# Altium footprint library ref-packages-longpad.PCBLIB: 1527 footprints (part 78 of 103)
Each footprint in its own frame and in the unit in brackets; x right, y up, seen from the top. Pads: shape width x height; smd on the part's side, far side on the other; paste and mask are expansions set on the pad; w line width, h text height; cw(c..) or ccw(c..) is an arc to the next point about the centre after c.
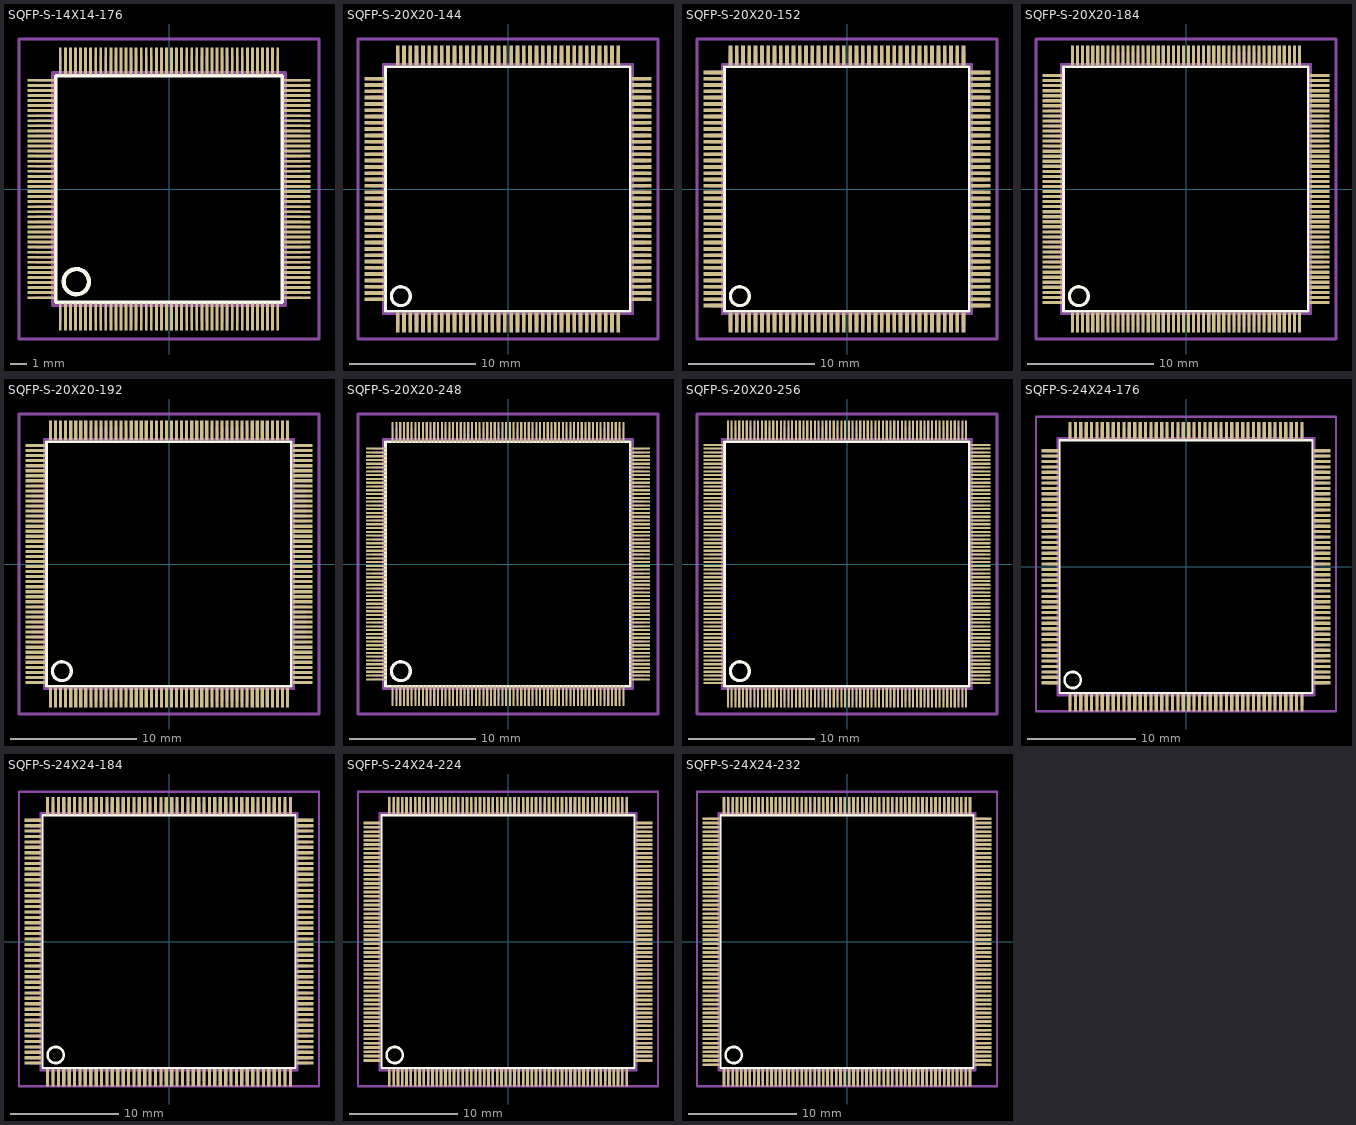
[diagram p77: the footprints below, top view; thin cyan lines are the x and y axes]

## SQFP-S-14X14-176 [mm]
pads (176):
  rect 0.17x1.6 smd: 1(-6.45,-7.6) 2(-6.15,-7.6) 3(-5.85,-7.6) 4(-5.55,-7.6) 5(-5.25,-7.6) 6(-4.95,-7.6) 7(-4.65,-7.6) 8(-4.35,-7.6) 9(-4.05,-7.6) 10(-3.75,-7.6) 11(-3.45,-7.6) 12(-3.15,-7.6) 13(-2.85,-7.6) 14(-2.55,-7.6) 15(-2.25,-7.6) 16(-1.95,-7.6) 17(-1.65,-7.6) 18(-1.35,-7.6) 19(-1.05,-7.6) 20(-0.75,-7.6) 21(-0.45,-7.6) 22(-0.15,-7.6) 23(0.15,-7.6) 24(0.45,-7.6) 25(0.75,-7.6) 26(1.05,-7.6) 27(1.35,-7.6) 28(1.65,-7.6) 29(1.95,-7.6) 30(2.25,-7.6) 31(2.55,-7.6) 32(2.85,-7.6) 33(3.15,-7.6) 34(3.45,-7.6) 35(3.75,-7.6) 36(4.05,-7.6) 37(4.35,-7.6) 38(4.65,-7.6) 39(4.95,-7.6) 40(5.25,-7.6) 41(5.55,-7.6) 42(5.85,-7.6) 43(6.15,-7.6) 44(6.45,-7.6) 89(6.45,7.6) 90(6.15,7.6) 91(5.85,7.6) 92(5.55,7.6) 93(5.25,7.6) 94(4.95,7.6) 95(4.65,7.6) 96(4.35,7.6) 97(4.05,7.6) 98(3.75,7.6) 99(3.45,7.6) 100(3.15,7.6) 101(2.85,7.6) 102(2.55,7.6) 103(2.25,7.6) 104(1.95,7.6) 105(1.65,7.6) 106(1.35,7.6) 107(1.05,7.6) 108(0.75,7.6) 109(0.45,7.6) 110(0.15,7.6) 111(-0.15,7.6) 112(-0.45,7.6) 113(-0.75,7.6) 114(-1.05,7.6) 115(-1.35,7.6) 116(-1.65,7.6) 117(-1.95,7.6) 118(-2.25,7.6) 119(-2.55,7.6) 120(-2.85,7.6) 121(-3.15,7.6) 122(-3.45,7.6) 123(-3.75,7.6) 124(-4.05,7.6) 125(-4.35,7.6) 126(-4.65,7.6) 127(-4.95,7.6) 128(-5.25,7.6) 129(-5.55,7.6) 130(-5.85,7.6) 131(-6.15,7.6) 132(-6.45,7.6)
  rect 1.6x0.17 smd: 45(7.6,-6.45) 46(7.6,-6.15) 47(7.6,-5.85) 48(7.6,-5.55) 49(7.6,-5.25) 50(7.6,-4.95) 51(7.6,-4.65) 52(7.6,-4.35) 53(7.6,-4.05) 54(7.6,-3.75) 55(7.6,-3.45) 56(7.6,-3.15) 57(7.6,-2.85) 58(7.6,-2.55) 59(7.6,-2.25) 60(7.6,-1.95) 61(7.6,-1.65) 62(7.6,-1.35) 63(7.6,-1.05) 64(7.6,-0.75) 65(7.6,-0.45) 66(7.6,-0.15) 67(7.6,0.15) 68(7.6,0.45) 69(7.6,0.75) 70(7.6,1.05) 71(7.6,1.35) 72(7.6,1.65) 73(7.6,1.95) 74(7.6,2.25) 75(7.6,2.55) 76(7.6,2.85) 77(7.6,3.15) 78(7.6,3.45) 79(7.6,3.75) 80(7.6,4.05) 81(7.6,4.35) 82(7.6,4.65) 83(7.6,4.95) 84(7.6,5.25) 85(7.6,5.55) 86(7.6,5.85) 87(7.6,6.15) 88(7.6,6.45) 133(-7.6,6.45) 134(-7.6,6.15) 135(-7.6,5.85) 136(-7.6,5.55) 137(-7.6,5.25) 138(-7.6,4.95) 139(-7.6,4.65) 140(-7.6,4.35) 141(-7.6,4.05) 142(-7.6,3.75) 143(-7.6,3.45) 144(-7.6,3.15) 145(-7.6,2.85) 146(-7.6,2.55) 147(-7.6,2.25) 148(-7.6,1.95) 149(-7.6,1.65) 150(-7.6,1.35) 151(-7.6,1.05) 152(-7.6,0.75) 153(-7.6,0.45) 154(-7.6,0.15) 155(-7.6,-0.15) 156(-7.6,-0.45) 157(-7.6,-0.75) 158(-7.6,-1.05) 159(-7.6,-1.35) 160(-7.6,-1.65) 161(-7.6,-1.95) 162(-7.6,-2.25) 163(-7.6,-2.55) 164(-7.6,-2.85) 165(-7.6,-3.15) 166(-7.6,-3.45) 167(-7.6,-3.75) 168(-7.6,-4.05) 169(-7.6,-4.35) 170(-7.6,-4.65) 171(-7.6,-4.95) 172(-7.6,-5.25) 173(-7.6,-5.55) 174(-7.6,-5.85) 175(-7.6,-6.15) 176(-7.6,-6.45)
Top Overlay:
  circle w0.254: c-5.5,-5.5 r0.75
  lines w0.203: -6.72,-6.71 6.71,-6.71 6.71,6.71 -6.72,6.71 -6.72,-6.71
Mechanical 16:
  drawing of 180 lines, arcs and shapes, not listed
Mechanical 27:
  lines w0.2: -8.9,-8.9 -8.9,8.9 8.9,8.9 8.9,-8.9 -8.9,-8.9

## SQFP-S-20X20-144 [mil]
pads (144):
  rect 11.81x62.99 smd: 1(-344.49,-417.32) 2(-324.8,-417.32) 3(-305.12,-417.32) 4(-285.43,-417.32) 5(-265.75,-417.32) 6(-246.06,-417.32) 7(-226.38,-417.32) 8(-206.69,-417.32) 9(-187.01,-417.32) 10(-167.32,-417.32) 11(-147.64,-417.32) 12(-127.95,-417.32) 13(-108.27,-417.32) 14(-88.58,-417.32) 15(-68.9,-417.32) 16(-49.21,-417.32) 17(-29.53,-417.32) 18(-9.84,-417.32) 19(9.84,-417.32) 20(29.53,-417.32) 21(49.21,-417.32) 22(68.9,-417.32) 23(88.58,-417.32) 24(108.27,-417.32) 25(127.95,-417.32) 26(147.64,-417.32) 27(167.32,-417.32) 28(187.01,-417.32) 29(206.69,-417.32) 30(226.38,-417.32) 31(246.06,-417.32) 32(265.75,-417.32) 33(285.43,-417.32) 34(305.12,-417.32) 35(324.8,-417.32) 36(344.49,-417.32) 73(344.49,417.32) 74(324.8,417.32) 75(305.12,417.32) 76(285.43,417.32) 77(265.75,417.32) 78(246.06,417.32) 79(226.38,417.32) 80(206.69,417.32) 81(187.01,417.32) 82(167.32,417.32) 83(147.64,417.32) 84(127.95,417.32) 85(108.27,417.32) 86(88.58,417.32) 87(68.9,417.32) 88(49.21,417.32) 89(29.53,417.32) 90(9.84,417.32) 91(-9.84,417.32) 92(-29.53,417.32) 93(-49.21,417.32) 94(-68.9,417.32) 95(-88.58,417.32) 96(-108.27,417.32) 97(-127.95,417.32) 98(-147.64,417.32) 99(-167.32,417.32) 100(-187.01,417.32) 101(-206.69,417.32) 102(-226.38,417.32) 103(-246.06,417.32) 104(-265.75,417.32) 105(-285.43,417.32) 106(-305.12,417.32) 107(-324.8,417.32) 108(-344.49,417.32)
  rect 62.99x11.81 smd: 37(417.32,-344.49) 38(417.32,-324.8) 39(417.32,-305.12) 40(417.32,-285.43) 41(417.32,-265.75) 42(417.32,-246.06) 43(417.32,-226.38) 44(417.32,-206.69) 45(417.32,-187.01) 46(417.32,-167.32) 47(417.32,-147.64) 48(417.32,-127.95) 49(417.32,-108.27) 50(417.32,-88.58) 51(417.32,-68.9) 52(417.32,-49.21) 53(417.32,-29.53) 54(417.32,-9.84) 55(417.32,9.84) 56(417.32,29.53) 57(417.32,49.21) 58(417.32,68.9) 59(417.32,88.58) 60(417.32,108.27) 61(417.32,127.95) 62(417.32,147.64) 63(417.32,167.32) 64(417.32,187.01) 65(417.32,206.69) 66(417.32,226.38) 67(417.32,246.06) 68(417.32,265.75) 69(417.32,285.43) 70(417.32,305.12) 71(417.32,324.8) 72(417.32,344.49) 109(-417.32,344.49) 110(-417.32,324.8) 111(-417.32,305.12) 112(-417.32,285.43) 113(-417.32,265.75) 114(-417.32,246.06) 115(-417.32,226.38) 116(-417.32,206.69) 117(-417.32,187.01) 118(-417.32,167.32) 119(-417.32,147.64) 120(-417.32,127.95) 121(-417.32,108.27) 122(-417.32,88.58) 123(-417.32,68.9) 124(-417.32,49.21) 125(-417.32,29.53) 126(-417.32,9.84) 127(-417.32,-9.84) 128(-417.32,-29.53) 129(-417.32,-49.21) 130(-417.32,-68.9) 131(-417.32,-88.58) 132(-417.32,-108.27) 133(-417.32,-127.95) 134(-417.32,-147.64) 135(-417.32,-167.32) 136(-417.32,-187.01) 137(-417.32,-206.69) 138(-417.32,-226.38) 139(-417.32,-246.06) 140(-417.32,-265.75) 141(-417.32,-285.43) 142(-417.32,-305.12) 143(-417.32,-324.8) 144(-417.32,-344.49)
Top Overlay:
  circle w10: c-334.65,-334.65 r29.53
  lines w8: -382.68,-382.28 382.28,-382.28 382.28,382.28 -382.68,382.28 -382.68,-382.28
Mechanical 16:
  rectangle: -350.39,-429.13 -338.58,-391.73
  rectangle: -330.71,-429.13 -318.9,-391.73
  rectangle: -311.02,-429.13 -299.21,-391.73
  rectangle: -291.34,-429.13 -279.53,-391.73
  rectangle: -271.65,-429.13 -259.84,-391.73
  rectangle: -251.97,-429.13 -240.16,-391.73
  rectangle: -232.28,-429.13 -220.47,-391.73
  rectangle: -212.6,-429.13 -200.79,-391.73
  rectangle: -192.91,-429.13 -181.1,-391.73
  rectangle: -173.23,-429.13 -161.42,-391.73
  rectangle: -153.54,-429.13 -141.73,-391.73
  rectangle: -133.86,-429.13 -122.05,-391.73
  rectangle: -114.17,-429.13 -102.36,-391.73
  rectangle: -94.49,-429.13 -82.68,-391.73
  rectangle: -74.8,-429.13 -62.99,-391.73
  rectangle: -55.12,-429.13 -43.31,-391.73
  rectangle: -35.43,-429.13 -23.62,-391.73
  rectangle: -15.75,-429.13 -3.94,-391.73
  rectangle: 3.94,-429.13 15.75,-391.73
  rectangle: 23.62,-429.13 35.43,-391.73
  rectangle: 43.31,-429.13 55.12,-391.73
  rectangle: 62.99,-429.13 74.8,-391.73
  rectangle: 82.68,-429.13 94.49,-391.73
  rectangle: 102.36,-429.13 114.17,-391.73
  rectangle: 122.05,-429.13 133.86,-391.73
  rectangle: 141.73,-429.13 153.54,-391.73
  rectangle: 161.42,-429.13 173.23,-391.73
  rectangle: 181.1,-429.13 192.91,-391.73
  rectangle: 200.79,-429.13 212.6,-391.73
  rectangle: 220.47,-429.13 232.28,-391.73
  rectangle: 240.16,-429.13 251.97,-391.73
  rectangle: 259.84,-429.13 271.65,-391.73
  rectangle: 279.53,-429.13 291.34,-391.73
  rectangle: 299.21,-429.13 311.02,-391.73
  rectangle: 318.9,-429.13 330.71,-391.73
  rectangle: 338.58,-429.13 350.39,-391.73
  rectangle: 391.73,-350.39 429.13,-338.58
  rectangle: 391.73,-330.71 429.13,-318.9
  rectangle: 391.73,-311.02 429.13,-299.21
  rectangle: 391.73,-291.34 429.13,-279.53
  rectangle: 391.73,-271.65 429.13,-259.84
  rectangle: 391.73,-251.97 429.13,-240.16
  rectangle: 391.73,-232.28 429.13,-220.47
  rectangle: 391.73,-212.6 429.13,-200.79
  rectangle: 391.73,-192.91 429.13,-181.1
  rectangle: 391.73,-173.23 429.13,-161.42
  rectangle: 391.73,-153.54 429.13,-141.73
  rectangle: 391.73,-133.86 429.13,-122.05
  rectangle: 391.73,-114.17 429.13,-102.36
  rectangle: 391.73,-94.49 429.13,-82.68
  rectangle: 391.73,-74.8 429.13,-62.99
  rectangle: 391.73,-55.12 429.13,-43.31
  rectangle: 391.73,-35.43 429.13,-23.62
  rectangle: 391.73,-15.75 429.13,-3.94
  rectangle: 391.73,3.94 429.13,15.75
  rectangle: 391.73,23.62 429.13,35.43
  rectangle: 391.73,43.31 429.13,55.12
  rectangle: 391.73,62.99 429.13,74.8
  rectangle: 391.73,82.68 429.13,94.49
  rectangle: 391.73,102.36 429.13,114.17
  rectangle: 391.73,122.05 429.13,133.86
  rectangle: 391.73,141.73 429.13,153.54
  rectangle: 391.73,161.42 429.13,173.23
  rectangle: 391.73,181.1 429.13,192.91
  rectangle: 391.73,200.79 429.13,212.6
  rectangle: 391.73,220.47 429.13,232.28
  rectangle: 391.73,240.16 429.13,251.97
  rectangle: 391.73,259.84 429.13,271.65
  rectangle: 391.73,279.53 429.13,291.34
  rectangle: 391.73,299.21 429.13,311.02
  rectangle: 391.73,318.9 429.13,330.71
  rectangle: 391.73,338.58 429.13,350.39
  rectangle: 338.58,391.73 350.39,429.13
  rectangle: 318.9,391.73 330.71,429.13
  rectangle: 299.21,391.73 311.02,429.13
  rectangle: 279.53,391.73 291.34,429.13
  rectangle: 259.84,391.73 271.65,429.13
  rectangle: 240.16,391.73 251.97,429.13
  rectangle: 220.47,391.73 232.28,429.13
  rectangle: 200.79,391.73 212.6,429.13
  rectangle: 181.1,391.73 192.91,429.13
  rectangle: 161.42,391.73 173.23,429.13
  rectangle: 141.73,391.73 153.54,429.13
  rectangle: 122.05,391.73 133.86,429.13
  rectangle: 102.36,391.73 114.17,429.13
  rectangle: 82.68,391.73 94.49,429.13
  rectangle: 62.99,391.73 74.8,429.13
  rectangle: 43.31,391.73 55.12,429.13
  rectangle: 23.62,391.73 35.43,429.13
  rectangle: 3.94,391.73 15.75,429.13
  rectangle: -15.75,391.73 -3.94,429.13
  rectangle: -35.43,391.73 -23.62,429.13
  rectangle: -55.12,391.73 -43.31,429.13
  rectangle: -74.8,391.73 -62.99,429.13
  rectangle: -94.49,391.73 -82.68,429.13
  rectangle: -114.17,391.73 -102.36,429.13
  rectangle: -133.86,391.73 -122.05,429.13
  rectangle: -153.54,391.73 -141.73,429.13
  rectangle: -173.23,391.73 -161.42,429.13
  rectangle: -192.91,391.73 -181.1,429.13
  rectangle: -212.6,391.73 -200.79,429.13
  rectangle: -232.28,391.73 -220.47,429.13
  rectangle: -251.97,391.73 -240.16,429.13
  rectangle: -271.65,391.73 -259.84,429.13
  rectangle: -291.34,391.73 -279.53,429.13
  rectangle: -311.02,391.73 -299.21,429.13
  rectangle: -330.71,391.73 -318.9,429.13
  rectangle: -350.39,391.73 -338.58,429.13
  rectangle: -429.13,338.58 -391.73,350.39
  rectangle: -429.13,318.9 -391.73,330.71
  rectangle: -429.13,299.21 -391.73,311.02
  rectangle: -429.13,279.53 -391.73,291.34
  rectangle: -429.13,259.84 -391.73,271.65
  rectangle: -429.13,240.16 -391.73,251.97
  rectangle: -429.13,220.47 -391.73,232.28
  rectangle: -429.13,200.79 -391.73,212.6
  rectangle: -429.13,181.1 -391.73,192.91
  rectangle: -429.13,161.42 -391.73,173.23
  rectangle: -429.13,141.73 -391.73,153.54
  rectangle: -429.13,122.05 -391.73,133.86
  rectangle: -429.13,102.36 -391.73,114.17
  rectangle: -429.13,82.68 -391.73,94.49
  rectangle: -429.13,62.99 -391.73,74.8
  rectangle: -429.13,43.31 -391.73,55.12
  rectangle: -429.13,23.62 -391.73,35.43
  rectangle: -429.13,3.94 -391.73,15.75
  rectangle: -429.13,-15.75 -391.73,-3.94
  rectangle: -429.13,-35.43 -391.73,-23.62
  rectangle: -429.13,-55.12 -391.73,-43.31
  rectangle: -429.13,-74.8 -391.73,-62.99
  rectangle: -429.13,-94.49 -391.73,-82.68
  rectangle: -429.13,-114.17 -391.73,-102.36
  rectangle: -429.13,-133.86 -391.73,-122.05
  rectangle: -429.13,-153.54 -391.73,-141.73
  rectangle: -429.13,-173.23 -391.73,-161.42
  rectangle: -429.13,-192.91 -391.73,-181.1
  rectangle: -429.13,-212.6 -391.73,-200.79
  rectangle: -429.13,-232.28 -391.73,-220.47
  rectangle: -429.13,-251.97 -391.73,-240.16
  rectangle: -429.13,-271.65 -391.73,-259.84
  rectangle: -429.13,-291.34 -391.73,-279.53
  rectangle: -429.13,-311.02 -391.73,-299.21
  rectangle: -429.13,-330.71 -391.73,-318.9
  rectangle: -429.13,-350.39 -391.73,-338.58
  lines w8: -390.16,-390.16 390.16,-390.16 390.16,390.16 -390.16,390.16 -390.16,-390.16
Mechanical 27:
  lines w7.87: -468.5,-468.5 -468.5,468.5 468.5,468.5 468.5,-468.5 -468.5,-468.5

## SQFP-S-20X20-152 [mil]
pads (152):
  rect 11.81x62.99 smd: 1(-364.17,-417.32) 2(-344.49,-417.32) 3(-324.8,-417.32) 4(-305.12,-417.32) 5(-285.43,-417.32) 6(-265.75,-417.32) 7(-246.06,-417.32) 8(-226.38,-417.32) 9(-206.69,-417.32) 10(-187.01,-417.32) 11(-167.32,-417.32) 12(-147.64,-417.32) 13(-127.95,-417.32) 14(-108.27,-417.32) 15(-88.58,-417.32) 16(-68.9,-417.32) 17(-49.21,-417.32) 18(-29.53,-417.32) 19(-9.84,-417.32) 20(9.84,-417.32) 21(29.53,-417.32) 22(49.21,-417.32) 23(68.9,-417.32) 24(88.58,-417.32) 25(108.27,-417.32) 26(127.95,-417.32) 27(147.64,-417.32) 28(167.32,-417.32) 29(187.01,-417.32) 30(206.69,-417.32) 31(226.38,-417.32) 32(246.06,-417.32) 33(265.75,-417.32) 34(285.43,-417.32) 35(305.12,-417.32) 36(324.8,-417.32) 37(344.49,-417.32) 38(364.17,-417.32) 77(364.17,417.32) 78(344.49,417.32) 79(324.8,417.32) 80(305.12,417.32) 81(285.43,417.32) 82(265.75,417.32) 83(246.06,417.32) 84(226.38,417.32) 85(206.69,417.32) 86(187.01,417.32) 87(167.32,417.32) 88(147.64,417.32) 89(127.95,417.32) 90(108.27,417.32) 91(88.58,417.32) 92(68.9,417.32) 93(49.21,417.32) 94(29.53,417.32) 95(9.84,417.32) 96(-9.84,417.32) 97(-29.53,417.32) 98(-49.21,417.32) 99(-68.9,417.32) 100(-88.58,417.32) 101(-108.27,417.32) 102(-127.95,417.32) 103(-147.64,417.32) 104(-167.32,417.32) 105(-187.01,417.32) 106(-206.69,417.32) 107(-226.38,417.32) 108(-246.06,417.32) 109(-265.75,417.32) 110(-285.43,417.32) 111(-305.12,417.32) 112(-324.8,417.32) 113(-344.49,417.32) 114(-364.17,417.32)
  rect 62.99x11.81 smd: 39(417.32,-364.17) 40(417.32,-344.49) 41(417.32,-324.8) 42(417.32,-305.12) 43(417.32,-285.43) 44(417.32,-265.75) 45(417.32,-246.06) 46(417.32,-226.38) 47(417.32,-206.69) 48(417.32,-187.01) 49(417.32,-167.32) 50(417.32,-147.64) 51(417.32,-127.95) 52(417.32,-108.27) 53(417.32,-88.58) 54(417.32,-68.9) 55(417.32,-49.21) 56(417.32,-29.53) 57(417.32,-9.84) 58(417.32,9.84) 59(417.32,29.53) 60(417.32,49.21) 61(417.32,68.9) 62(417.32,88.58) 63(417.32,108.27) 64(417.32,127.95) 65(417.32,147.64) 66(417.32,167.32) 67(417.32,187.01) 68(417.32,206.69) 69(417.32,226.38) 70(417.32,246.06) 71(417.32,265.75) 72(417.32,285.43) 73(417.32,305.12) 74(417.32,324.8) 75(417.32,344.49) 76(417.32,364.17) 115(-417.32,364.17) 116(-417.32,344.49) 117(-417.32,324.8) 118(-417.32,305.12) 119(-417.32,285.43) 120(-417.32,265.75) 121(-417.32,246.06) 122(-417.32,226.38) 123(-417.32,206.69) 124(-417.32,187.01) 125(-417.32,167.32) 126(-417.32,147.64) 127(-417.32,127.95) 128(-417.32,108.27) 129(-417.32,88.58) 130(-417.32,68.9) 131(-417.32,49.21) 132(-417.32,29.53) 133(-417.32,9.84) 134(-417.32,-9.84) 135(-417.32,-29.53) 136(-417.32,-49.21) 137(-417.32,-68.9) 138(-417.32,-88.58) 139(-417.32,-108.27) 140(-417.32,-127.95) 141(-417.32,-147.64) 142(-417.32,-167.32) 143(-417.32,-187.01) 144(-417.32,-206.69) 145(-417.32,-226.38) 146(-417.32,-246.06) 147(-417.32,-265.75) 148(-417.32,-285.43) 149(-417.32,-305.12) 150(-417.32,-324.8) 151(-417.32,-344.49) 152(-417.32,-364.17)
Top Overlay:
  circle w10: c-334.65,-334.65 r29.53
  lines w8: -382.68,-382.28 382.28,-382.28 382.28,382.28 -382.68,382.28 -382.68,-382.28
Mechanical 16:
  drawing of 156 lines, arcs and shapes, not listed
Mechanical 27:
  lines w7.87: -468.5,-468.5 -468.5,468.5 468.5,468.5 468.5,-468.5 -468.5,-468.5

## SQFP-S-20X20-184 [mm]
pads (184):
  rect 0.25x1.6 smd: 1(-9,-10.6) 2(-8.6,-10.6) 3(-8.2,-10.6) 4(-7.8,-10.6) 5(-7.4,-10.6) 6(-7,-10.6) 7(-6.6,-10.6) 8(-6.2,-10.6) 9(-5.8,-10.6) 10(-5.4,-10.6) 11(-5,-10.6) 12(-4.6,-10.6) 13(-4.2,-10.6) 14(-3.8,-10.6) 15(-3.4,-10.6) 16(-3,-10.6) 17(-2.6,-10.6) 18(-2.2,-10.6) 19(-1.8,-10.6) 20(-1.4,-10.6) 21(-1,-10.6) 22(-0.6,-10.6) 23(-0.2,-10.6) 24(0.2,-10.6) 25(0.6,-10.6) 26(1,-10.6) 27(1.4,-10.6) 28(1.8,-10.6) 29(2.2,-10.6) 30(2.6,-10.6) 31(3,-10.6) 32(3.4,-10.6) 33(3.8,-10.6) 34(4.2,-10.6) 35(4.6,-10.6) 36(5,-10.6) 37(5.4,-10.6) 38(5.8,-10.6) 39(6.2,-10.6) 40(6.6,-10.6) 41(7,-10.6) 42(7.4,-10.6) 43(7.8,-10.6) 44(8.2,-10.6) 45(8.6,-10.6) 46(9,-10.6) 93(9,10.6) 94(8.6,10.6) 95(8.2,10.6) 96(7.8,10.6) 97(7.4,10.6) 98(7,10.6) 99(6.6,10.6) 100(6.2,10.6) 101(5.8,10.6) 102(5.4,10.6) 103(5,10.6) 104(4.6,10.6) 105(4.2,10.6) 106(3.8,10.6) 107(3.4,10.6) 108(3,10.6) 109(2.6,10.6) 110(2.2,10.6) 111(1.8,10.6) 112(1.4,10.6) 113(1,10.6) 114(0.6,10.6) 115(0.2,10.6) 116(-0.2,10.6) 117(-0.6,10.6) 118(-1,10.6) 119(-1.4,10.6) 120(-1.8,10.6) 121(-2.2,10.6) 122(-2.6,10.6) 123(-3,10.6) 124(-3.4,10.6) 125(-3.8,10.6) 126(-4.2,10.6) 127(-4.6,10.6) 128(-5,10.6) 129(-5.4,10.6) 130(-5.8,10.6) 131(-6.2,10.6) 132(-6.6,10.6) 133(-7,10.6) 134(-7.4,10.6) 135(-7.8,10.6) 136(-8.2,10.6) 137(-8.6,10.6) 138(-9,10.6)
  rect 1.6x0.25 smd: 47(10.6,-9) 48(10.6,-8.6) 49(10.6,-8.2) 50(10.6,-7.8) 51(10.6,-7.4) 52(10.6,-7) 53(10.6,-6.6) 54(10.6,-6.2) 55(10.6,-5.8) 56(10.6,-5.4) 57(10.6,-5) 58(10.6,-4.6) 59(10.6,-4.2) 60(10.6,-3.8) 61(10.6,-3.4) 62(10.6,-3) 63(10.6,-2.6) 64(10.6,-2.2) 65(10.6,-1.8) 66(10.6,-1.4) 67(10.6,-1) 68(10.6,-0.6) 69(10.6,-0.2) 70(10.6,0.2) 71(10.6,0.6) 72(10.6,1) 73(10.6,1.4) 74(10.6,1.8) 75(10.6,2.2) 76(10.6,2.6) 77(10.6,3) 78(10.6,3.4) 79(10.6,3.8) 80(10.6,4.2) 81(10.6,4.6) 82(10.6,5) 83(10.6,5.4) 84(10.6,5.8) 85(10.6,6.2) 86(10.6,6.6) 87(10.6,7) 88(10.6,7.4) 89(10.6,7.8) 90(10.6,8.2) 91(10.6,8.6) 92(10.6,9) 139(-10.6,9) 140(-10.6,8.6) 141(-10.6,8.2) 142(-10.6,7.8) 143(-10.6,7.4) 144(-10.6,7) 145(-10.6,6.6) 146(-10.6,6.2) 147(-10.6,5.8) 148(-10.6,5.4) 149(-10.6,5) 150(-10.6,4.6) 151(-10.6,4.2) 152(-10.6,3.8) 153(-10.6,3.4) 154(-10.6,3) 155(-10.6,2.6) 156(-10.6,2.2) 157(-10.6,1.8) 158(-10.6,1.4) 159(-10.6,1) 160(-10.6,0.6) 161(-10.6,0.2) 162(-10.6,-0.2) 163(-10.6,-0.6) 164(-10.6,-1) 165(-10.6,-1.4) 166(-10.6,-1.8) 167(-10.6,-2.2) 168(-10.6,-2.6) 169(-10.6,-3) 170(-10.6,-3.4) 171(-10.6,-3.8) 172(-10.6,-4.2) 173(-10.6,-4.6) 174(-10.6,-5) 175(-10.6,-5.4) 176(-10.6,-5.8) 177(-10.6,-6.2) 178(-10.6,-6.6) 179(-10.6,-7) 180(-10.6,-7.4) 181(-10.6,-7.8) 182(-10.6,-8.2) 183(-10.6,-8.6) 184(-10.6,-9)
Top Overlay:
  circle w0.254: c-8.5,-8.5 r0.75
  lines w0.203: -9.72,-9.71 9.71,-9.71 9.71,9.71 -9.72,9.71 -9.72,-9.71
Mechanical 16:
  drawing of 188 lines, arcs and shapes, not listed
Mechanical 27:
  lines w0.2: -11.9,-11.9 -11.9,11.9 11.9,11.9 11.9,-11.9 -11.9,-11.9

## SQFP-S-20X20-192 [mm]
pads (192):
  rect 0.25x1.6 smd: 1(-9.4,-10.6) 2(-9,-10.6) 3(-8.6,-10.6) 4(-8.2,-10.6) 5(-7.8,-10.6) 6(-7.4,-10.6) 7(-7,-10.6) 8(-6.6,-10.6) 9(-6.2,-10.6) 10(-5.8,-10.6) 11(-5.4,-10.6) 12(-5,-10.6) 13(-4.6,-10.6) 14(-4.2,-10.6) 15(-3.8,-10.6) 16(-3.4,-10.6) 17(-3,-10.6) 18(-2.6,-10.6) 19(-2.2,-10.6) 20(-1.8,-10.6) 21(-1.4,-10.6) 22(-1,-10.6) 23(-0.6,-10.6) 24(-0.2,-10.6) 25(0.2,-10.6) 26(0.6,-10.6) 27(1,-10.6) 28(1.4,-10.6) 29(1.8,-10.6) 30(2.2,-10.6) 31(2.6,-10.6) 32(3,-10.6) 33(3.4,-10.6) 34(3.8,-10.6) 35(4.2,-10.6) 36(4.6,-10.6) 37(5,-10.6) 38(5.4,-10.6) 39(5.8,-10.6) 40(6.2,-10.6) 41(6.6,-10.6) 42(7,-10.6) 43(7.4,-10.6) 44(7.8,-10.6) 45(8.2,-10.6) 46(8.6,-10.6) 47(9,-10.6) 48(9.4,-10.6) 97(9.4,10.6) 98(9,10.6) 99(8.6,10.6) 100(8.2,10.6) 101(7.8,10.6) 102(7.4,10.6) 103(7,10.6) 104(6.6,10.6) 105(6.2,10.6) 106(5.8,10.6) 107(5.4,10.6) 108(5,10.6) 109(4.6,10.6) 110(4.2,10.6) 111(3.8,10.6) 112(3.4,10.6) 113(3,10.6) 114(2.6,10.6) 115(2.2,10.6) 116(1.8,10.6) 117(1.4,10.6) 118(1,10.6) 119(0.6,10.6) 120(0.2,10.6) 121(-0.2,10.6) 122(-0.6,10.6) 123(-1,10.6) 124(-1.4,10.6) 125(-1.8,10.6) 126(-2.2,10.6) 127(-2.6,10.6) 128(-3,10.6) 129(-3.4,10.6) 130(-3.8,10.6) 131(-4.2,10.6) 132(-4.6,10.6) 133(-5,10.6) 134(-5.4,10.6) 135(-5.8,10.6) 136(-6.2,10.6) 137(-6.6,10.6) 138(-7,10.6) 139(-7.4,10.6) 140(-7.8,10.6) 141(-8.2,10.6) 142(-8.6,10.6) 143(-9,10.6) 144(-9.4,10.6)
  rect 1.6x0.25 smd: 49(10.6,-9.4) 50(10.6,-9) 51(10.6,-8.6) 52(10.6,-8.2) 53(10.6,-7.8) 54(10.6,-7.4) 55(10.6,-7) 56(10.6,-6.6) 57(10.6,-6.2) 58(10.6,-5.8) 59(10.6,-5.4) 60(10.6,-5) 61(10.6,-4.6) 62(10.6,-4.2) 63(10.6,-3.8) 64(10.6,-3.4) 65(10.6,-3) 66(10.6,-2.6) 67(10.6,-2.2) 68(10.6,-1.8) 69(10.6,-1.4) 70(10.6,-1) 71(10.6,-0.6) 72(10.6,-0.2) 73(10.6,0.2) 74(10.6,0.6) 75(10.6,1) 76(10.6,1.4) 77(10.6,1.8) 78(10.6,2.2) 79(10.6,2.6) 80(10.6,3) 81(10.6,3.4) 82(10.6,3.8) 83(10.6,4.2) 84(10.6,4.6) 85(10.6,5) 86(10.6,5.4) 87(10.6,5.8) 88(10.6,6.2) 89(10.6,6.6) 90(10.6,7) 91(10.6,7.4) 92(10.6,7.8) 93(10.6,8.2) 94(10.6,8.6) 95(10.6,9) 96(10.6,9.4) 145(-10.6,9.4) 146(-10.6,9) 147(-10.6,8.6) 148(-10.6,8.2) 149(-10.6,7.8) 150(-10.6,7.4) 151(-10.6,7) 152(-10.6,6.6) 153(-10.6,6.2) 154(-10.6,5.8) 155(-10.6,5.4) 156(-10.6,5) 157(-10.6,4.6) 158(-10.6,4.2) 159(-10.6,3.8) 160(-10.6,3.4) 161(-10.6,3) 162(-10.6,2.6) 163(-10.6,2.2) 164(-10.6,1.8) 165(-10.6,1.4) 166(-10.6,1) 167(-10.6,0.6) 168(-10.6,0.2) 169(-10.6,-0.2) 170(-10.6,-0.6) 171(-10.6,-1) 172(-10.6,-1.4) 173(-10.6,-1.8) 174(-10.6,-2.2) 175(-10.6,-2.6) 176(-10.6,-3) 177(-10.6,-3.4) 178(-10.6,-3.8) 179(-10.6,-4.2) 180(-10.6,-4.6) 181(-10.6,-5) 182(-10.6,-5.4) 183(-10.6,-5.8) 184(-10.6,-6.2) 185(-10.6,-6.6) 186(-10.6,-7) 187(-10.6,-7.4) 188(-10.6,-7.8) 189(-10.6,-8.2) 190(-10.6,-8.6) 191(-10.6,-9) 192(-10.6,-9.4)